# Altium footprint library Cty1.PcbLib: 869 footprints (part 54 of 55)
Each footprint in its own frame and in the unit in brackets; x right, y up, seen from the top. Pads: shape width x height; smd on the part's side, far side on the other; paste and mask are expansions set on the pad; w line width, h text height; cw(c..) or ccw(c..) is an arc to the next point about the centre after c.
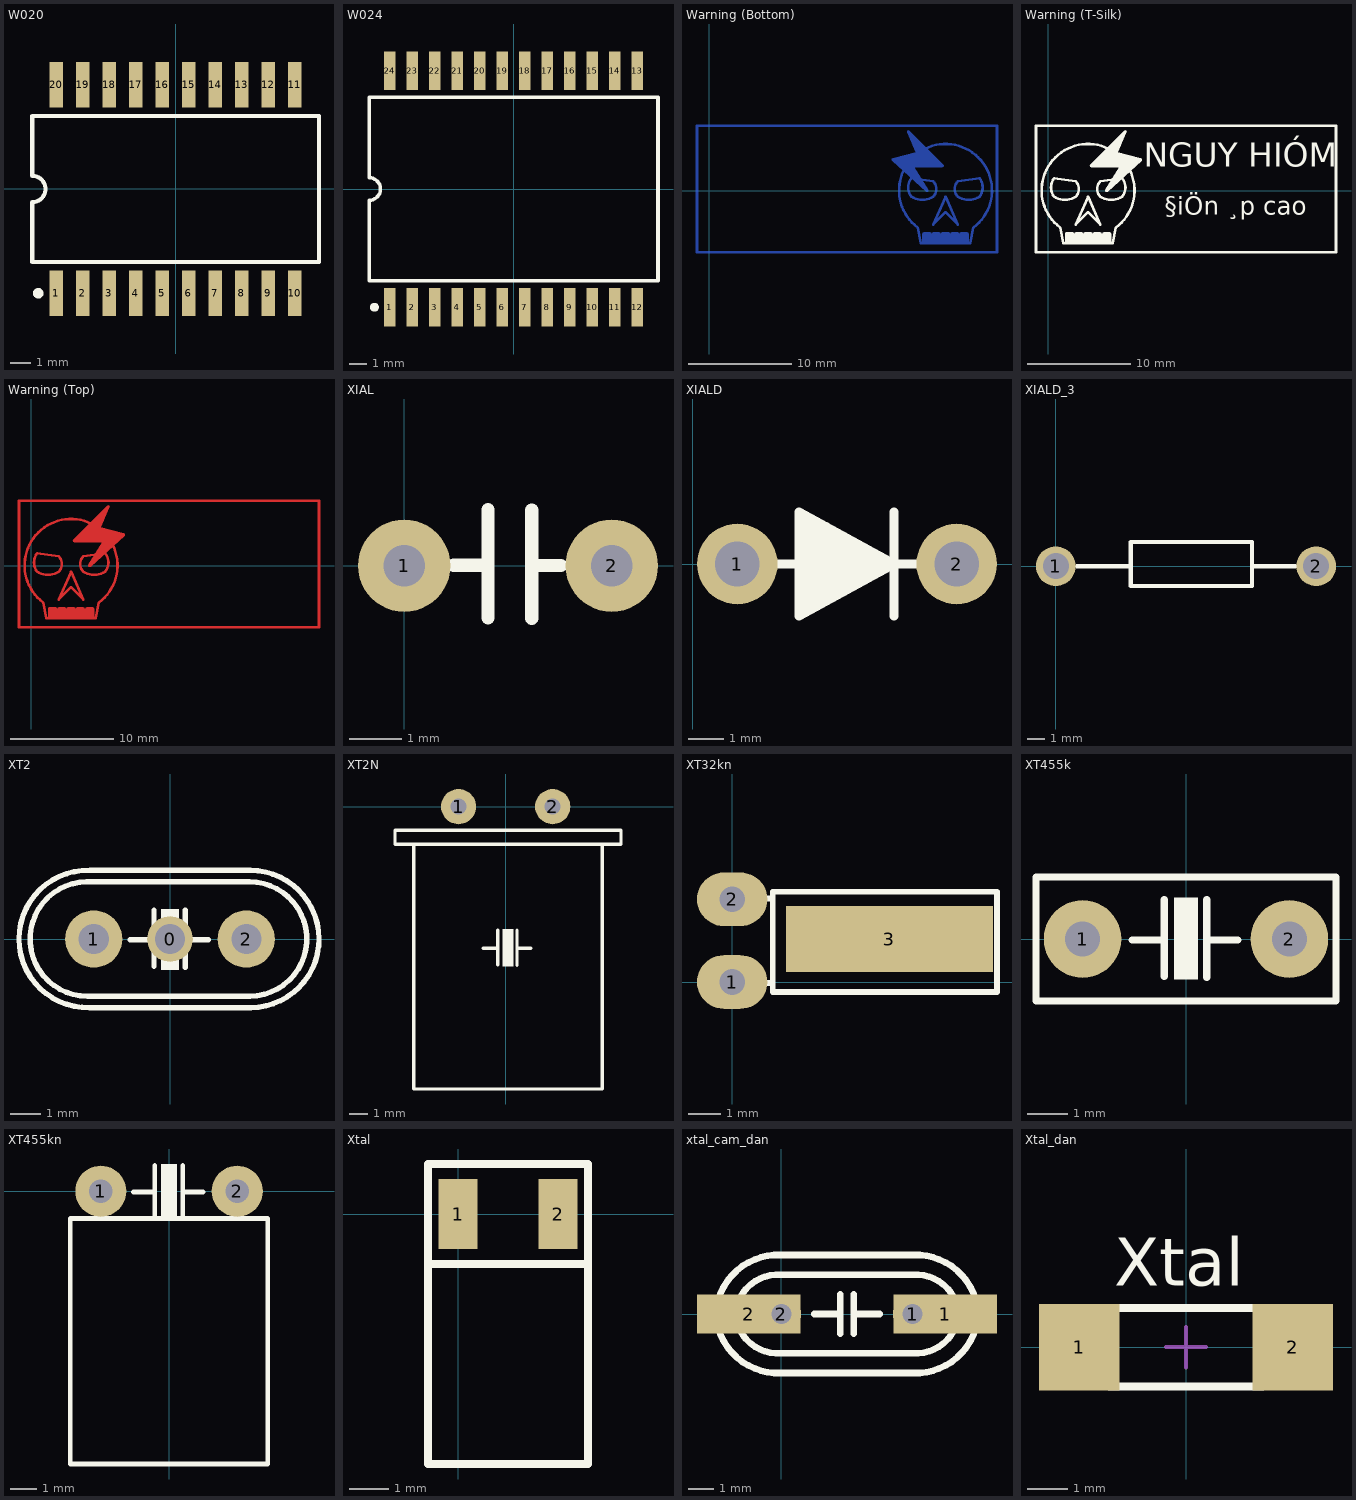
[diagram p53: the footprints below, top view; thin cyan lines are the x and y axes]

## W020 [mm] "DFP; 20 Leads; Body 13.7 x 7.6 mm (LxW max); Pitch 1.27 mm"
height 2.54
pads (20):
  rect 0.65x2.2 smd: 1(-5.715,-5) 2(-4.445,-5) 3(-3.175,-5) 4(-1.905,-5) 5(-0.635,-5) 6(0.635,-5) 7(1.905,-5) 8(3.175,-5) 9(4.445,-5) 10(5.715,-5) 11(5.715,5) 12(4.445,5) 13(3.175,5) 14(1.905,5) 15(0.635,5) 16(-0.635,5) 17(-1.905,5) 18(-3.175,5) 19(-4.445,5) 20(-5.715,5)
Top Overlay:
  circle w0.25: c-6.59,-5 r0.125
  lines w0.2: -6.875,-3.5 6.875,-3.5 6.875,3.5 -6.875,3.5 -6.875,0.635 cw(c-6.875,0) -6.875,-0.635 -6.875,-3.5

## W024 [mm] "DFP; 24 Leads; Body 16.3 x 9.5 mm (LxW max); Pitch 1.27 mm"
height 2.29
pads (24):
  rect 0.65x2.2 smd: 1(-6.985,-6.675) 2(-5.715,-6.675) 3(-4.445,-6.675) 4(-3.175,-6.675) 5(-1.905,-6.675) 6(-0.635,-6.675) 7(0.635,-6.675) 8(1.905,-6.675) 9(3.175,-6.675) 10(4.445,-6.675) 11(5.715,-6.675) 12(6.985,-6.675) 13(6.985,6.675) 14(5.715,6.675) 15(4.445,6.675) 16(3.175,6.675) 17(1.905,6.675) 18(0.635,6.675) 19(-0.635,6.675) 20(-1.905,6.675) 21(-3.175,6.675) 22(-4.445,6.675) 23(-5.715,6.675) 24(-6.985,6.675)
Top Overlay:
  circle w0.25: c-7.86,-6.675 r0.125
  lines w0.2: -8.15,-5.175 -8.15,-0.635 ccw(c-8.15,0) -8.15,0.635 -8.15,5.175 8.15,5.175 8.15,-5.175 -8.15,-5.175

## Warning (Bottom) [mil]
Bottom Layer:
  region: 760.38,229.5 759.27,229.49 758.54,228.74 757.57,228.34 757.15,227.32 756.38,226.53 756.39,225.48 755.99,224.52 756.41,223.49 756.43,222.38 789.37,145.51 701,123.43 699.74,122.5 698.31,121.82 698.12,121.3 697.68,120.97 697.44,119.41 696.91,117.93 697.15,117.42 697.07,116.87 698,115.6 698.68,114.18 828.66,-4 829.96,-4.47 831.08,-5.27 831.84,-5.15 832.56,-5.41 833.81,-4.82 835.17,-4.59 835.61,-3.97 836.3,-3.64 836.77,-2.34 837.57,-1.22 837.45,-0.46 837.71,0.26 837.12,1.51 836.89,2.87 782.98,89.12 891.38,89.12 895.21,90.71 896.8,94.53 895.21,98.36 765.23,228.34 764.2,228.77 763.41,229.54 762.37,229.53 761.4,229.93
  region: 958.46,-161.61 956.87,-165.43 956.87,-200.88 958.46,-204.71 962.28,-206.3 985.92,-206.3 989.74,-204.71 991.33,-200.88 991.33,-165.43 989.74,-161.61 985.92,-160.02 962.28,-160.02
  region: 852.11,-161.61 850.52,-165.43 850.52,-200.88 852.11,-204.71 855.93,-206.3 879.57,-206.3 883.39,-204.71 884.98,-200.88 884.98,-165.43 883.39,-161.61 879.57,-160.02 855.93,-160.02
  region: 816.66,-161.61 815.07,-165.43 815.07,-200.88 816.66,-204.71 820.48,-206.3 844.12,-206.3 847.94,-204.71 849.53,-200.88 849.53,-165.43 847.94,-161.61 844.12,-160.02 820.48,-160.02
  region: 923.01,-161.61 921.42,-165.43 921.42,-200.88 923.01,-204.71 926.83,-206.3 950.47,-206.3 954.29,-204.71 955.88,-200.88 955.88,-165.43 954.29,-161.61 950.47,-160.02 926.83,-160.02
  region: 887.56,-161.61 885.97,-165.43 885.97,-200.88 887.56,-204.71 891.38,-206.3 915,-206.3 918.83,-204.71 920.41,-200.88 920.41,-165.43 918.83,-161.61 915,-160.02 891.38,-160.02
  lines w10: -47.27,-236.33 1100,-236.33 1100,248.15 -47.27,248.15 -47.27,-236.33 ; 702.32,118.18 796.85,141.8 761.4,224.52 891.38,94.53 773.22,94.53 832.3,0 702.32,118.18 ; 773.22,-23.63 ccw(c814.58,41.35) 855.93,-23.63 ccw(c826.4,5.9) 855.93,35.45 773.22,47.27 ccw(c814.58,11.82) 773.22,-23.63 ; 796.85,-141.8 cw(c903.2,0.53) 1009.55,-141.8 997.73,-200.88 808.67,-200.88 796.85,-141.8 ; 855.93,-129.98 903.2,-23.63 950.47,-129.98 903.2,-82.72 855.93,-129.98 ; 950.46,-23.64 cw(c980,5.9) 950.47,35.45 1033.18,47.27 cw(c985.92,11.82) 1033.18,-23.63 cw(c991.83,41.35) 950.47,-23.63
  text "§iÖn ¸p cao" at 580,-120 h118.11
  text "NGUY HIÓM" at 690,45 h157.48

## Warning (T-Silk) [mil]
Top Overlay:
  region: 167.44,-161.61 169.03,-165.43 169.03,-200.88 167.44,-204.71 163.62,-206.3 140,-206.3 136.17,-204.71 134.59,-200.88 134.59,-165.43 136.17,-161.61 140,-160.02 163.62,-160.02
  region: 131.99,-161.61 133.58,-165.43 133.58,-200.88 131.99,-204.71 128.17,-206.3 104.53,-206.3 100.71,-204.71 99.12,-200.88 99.12,-165.43 100.71,-161.61 104.53,-160.02 128.17,-160.02
  region: 238.34,-161.61 239.93,-165.43 239.93,-200.88 238.34,-204.71 234.52,-206.3 210.88,-206.3 207.06,-204.71 205.47,-200.88 205.47,-165.43 207.06,-161.61 210.88,-160.02 234.52,-160.02
  region: 202.89,-161.61 204.48,-165.43 204.48,-200.88 202.89,-204.71 199.07,-206.3 175.43,-206.3 171.61,-204.71 170.02,-200.88 170.02,-165.43 171.61,-161.61 175.43,-160.02 199.07,-160.02
  region: 96.54,-161.61 98.13,-165.43 98.13,-200.88 96.54,-204.71 92.72,-206.3 69.08,-206.3 65.26,-204.71 63.67,-200.88 63.67,-165.43 65.26,-161.61 69.08,-160.02 92.72,-160.02
  region: 294.62,229.5 295.73,229.49 296.46,228.74 297.43,228.34 297.85,227.32 298.62,226.53 298.61,225.48 299.01,224.52 298.59,223.49 298.57,222.38 265.63,145.51 354,123.43 355.26,122.5 356.69,121.82 356.88,121.3 357.32,120.97 357.56,119.41 358.09,117.93 357.85,117.42 357.93,116.87 357,115.6 356.32,114.18 226.34,-4 225.04,-4.47 223.92,-5.27 223.16,-5.15 222.44,-5.41 221.19,-4.82 219.83,-4.59 219.39,-3.97 218.7,-3.64 218.23,-2.34 217.43,-1.22 217.55,-0.46 217.29,0.26 217.88,1.51 218.11,2.87 272.02,89.12 163.62,89.12 159.79,90.71 158.2,94.53 159.79,98.36 289.77,228.34 290.8,228.77 291.59,229.54 292.63,229.53 293.6,229.93
  lines w10: -47.27,-236.33 -47.27,248.15 1100,248.15 1100,-236.33 -47.27,-236.33 ; 21.81,-23.64 ccw(c63.17,41.35) 104.53,-23.63 ccw(c75,5.9) 104.53,35.45 21.82,47.27 ccw(c69.08,11.82) 21.82,-23.63 ; 45.45,-141.8 cw(c151.8,0.53) 258.15,-141.8 246.33,-200.88 57.27,-200.88 45.45,-141.8 ; 104.53,-129.98 151.8,-23.63 199.07,-129.98 151.8,-82.72 104.53,-129.98 ; 163.62,94.53 293.6,224.52 258.15,141.8 352.68,118.18 222.7,0 281.78,94.53 163.62,94.53 ; 199.06,-23.64 cw(c228.6,5.9) 199.07,35.45 281.78,47.27 cw(c240.42,11.82) 281.78,-23.63 cw(c240.42,41.35) 199.07,-23.63
  text "NGUY HIÓM" at 365,60 h157.48
  text "§iÖn ¸p cao" at 445,-115 h118.11

## Warning (Top) [mil]
Top Layer:
  region: 167.44,-161.61 169.03,-165.43 169.03,-200.88 167.44,-204.71 163.62,-206.3 140,-206.3 136.17,-204.71 134.59,-200.88 134.59,-165.43 136.17,-161.61 140,-160.02 163.62,-160.02
  region: 131.99,-161.61 133.58,-165.43 133.58,-200.88 131.99,-204.71 128.17,-206.3 104.53,-206.3 100.71,-204.71 99.12,-200.88 99.12,-165.43 100.71,-161.61 104.53,-160.02 128.17,-160.02
  region: 238.34,-161.61 239.93,-165.43 239.93,-200.88 238.34,-204.71 234.52,-206.3 210.88,-206.3 207.06,-204.71 205.47,-200.88 205.47,-165.43 207.06,-161.61 210.88,-160.02 234.52,-160.02
  region: 202.89,-161.61 204.48,-165.43 204.48,-200.88 202.89,-204.71 199.07,-206.3 175.43,-206.3 171.61,-204.71 170.02,-200.88 170.02,-165.43 171.61,-161.61 175.43,-160.02 199.07,-160.02
  region: 96.54,-161.61 98.13,-165.43 98.13,-200.88 96.54,-204.71 92.72,-206.3 69.08,-206.3 65.26,-204.71 63.67,-200.88 63.67,-165.43 65.26,-161.61 69.08,-160.02 92.72,-160.02
  region: 294.62,229.5 295.73,229.49 296.46,228.74 297.43,228.34 297.85,227.32 298.62,226.53 298.61,225.48 299.01,224.52 298.59,223.49 298.57,222.38 265.63,145.51 354,123.43 355.26,122.5 356.69,121.82 356.88,121.3 357.32,120.97 357.56,119.41 358.09,117.93 357.85,117.42 357.93,116.87 357,115.6 356.32,114.18 226.34,-4 225.04,-4.47 223.92,-5.27 223.16,-5.15 222.44,-5.41 221.19,-4.82 219.83,-4.59 219.39,-3.97 218.7,-3.64 218.23,-2.34 217.43,-1.22 217.55,-0.46 217.29,0.26 217.88,1.51 218.11,2.87 272.02,89.12 163.62,89.12 159.79,90.71 158.2,94.53 159.79,98.36 289.77,228.34 290.8,228.77 291.59,229.54 292.63,229.53 293.6,229.93
  lines w10: -47.27,-236.33 -47.27,248.15 1100,248.15 1100,-236.33 -47.27,-236.33 ; 21.81,-23.64 ccw(c63.17,41.35) 104.53,-23.63 ccw(c75,5.9) 104.53,35.45 21.82,47.27 ccw(c69.08,11.82) 21.82,-23.63 ; 45.45,-141.8 cw(c151.8,0.53) 258.15,-141.8 246.33,-200.88 57.27,-200.88 45.45,-141.8 ; 104.53,-129.98 151.8,-23.63 199.07,-129.98 151.8,-82.72 104.53,-129.98 ; 163.62,94.53 293.6,224.52 258.15,141.8 352.68,118.18 222.7,0 281.78,94.53 163.62,94.53 ; 199.06,-23.64 cw(c228.6,5.9) 199.07,35.45 281.78,47.27 cw(c240.42,11.82) 281.78,-23.63 cw(c240.42,41.35) 199.07,-23.63
  text "NGUY HIÓM" at 365,60 h157.48
  text "§iÖn ¸p cao" at 445,-115 h118.11

## XIAL [mil]
pads (2):
  round 70 hole 31.5 unplated: 1(0,0) 2(157.48,0)
Top Overlay:
  lines w10: 37.4,0.4 53.6,0.4 63.6,0.4 ; 63.6,-39.6 63.6,0.4 ; 63.6,42.4 63.6,0.4 ; 96.8,-39.8 96.8,42.2 ; 96.8,0.2 104.8,0.2 119,0.2

## XIALD [mil]
pads (2):
  round 90 hole 50 unplated: 1(50,0) 2(295,0)
Top Overlay:
  lines w10: 65,0 119,0 ; 127,-48 127,50 ; 127,46 135,46 135,-42 143,-42 143,42 149,42 149,-32 157,-32 157,34 163,34 163,-28 171,-28 171,24 179,24 179,-20 185,-20 185,18 191,18 191,-14 197,-14 197,12 201,12 201,-8 207,-8 ; 220,0 265,0 ; 225,-58 225,0 ; 225,58 225,0 ; 119,0 119,-58 225,0 ; 119,0 119,58 225,0 ; 207,-8 211,-8 211,8 207,8 207,-8

## XIALD_3 [mil]
pads (2):
  round 90 hole 59.05 unplated: 1(0,0) 2(590.55,0)
Top Overlay:
  lines w10: 47.95,0 166.06,0 ; 447.59,0 542.76,0 ; 170,-45 170,55 445,55 445,-45 170,-45

## XT2 [mm] "Footpin for Crystal 2 pin"
pads (3):
  round 1.524 hole 1: 0(0,0)
  round 1.905 hole 1: 1(-2.54,0) 2(2.54,0)
Top Overlay:
  region: 0.292,0.991 0.292,-1.016 -0.292,-1.016 -0.292,0.991
  lines w0.178: -2.769,1.905 ccw(c-2.756,0) -2.75,-1.905 ; -2.717,-1.905 2.617,-1.905 ; -2.692,1.905 2.642,1.905 ; -2.668,-2.286 2.69,-2.286 ccw(c2.675,0) 2.668,2.286 -2.666,2.286 ccw(c-2.743,0.001) -2.668,-2.283 ; -1.321,-0.025 -0.533,-0.025 ; -0.533,-0.914 -0.533,0.965 ; 0.508,-0.94 0.508,0.965 ; 0.508,-0.025 1.27,-0.025 ; 2.642,1.905 cw(c2.647,0) 2.66,-1.905
3D body: height 3.5, standoff -4, extent -5.929,-2.364 5.421,2.286

## XT2N [mil] "Crystal 2pin, high 200 mil"
height 200
pads (2):
  round 75 hole 34: 1(-100,0) 2(100,0)
Top Overlay:
  region: 16.5,-260 16.5,-339 -6.5,-339 -6.5,-260
  lines w7: -48,-301 -17,-301 ; -17,-336 -17,-262 ; 24,-337 24,-262 ; 24,-301 54,-301 ; -235,-80 -235,-50 ; -235,-80 -195,-80 ; -235,-80 -235,-50 ; -235,-80 -195,-80 ; -235,-50 245,-50 ; -235,-50 245,-50 ; -195,-600 205,-600 ; -195,-600 -195,-80 ; -195,-600 205,-600 ; -195,-600 -195,-80 ; -195,-80 205,-80 ; -195,-80 205,-80 ; 205,-600 205,-80 ; 205,-600 205,-80 ; 205,-80 245,-80 ; 205,-80 245,-80 ; 245,-80 245,-50 ; 245,-80 245,-50
3D body: height 91.44, standoff -92.52, extent -209.86,-594.33 230,14.33

## XT32kn [mil] "Crystal for 32,768kHz, 2pin"
height 150
pads (3):
  oval 85x65 hole 31: 1(0,0) 2(0,100)
  rect 250x80 smd: 3(190,52)
Top Overlay:
  lines w7: 34,-1 49,-1 ; 35,101 49,101 ; 49,101 49,-12 320,-12 320,109 49,109 49,101

## XT455k [mil] "Thach anh 455khz (Infrared)"
pads (2):
  round 75 hole 34: 1(-100,0) 2(100,0)
Top Overlay:
  region: 11.5,40 11.5,-39 -11.5,-39 -11.5,40
  lines w7: -52,-1 -21,-1 ; -21,-36 -21,38 ; 20,-37 20,38 ; 20,-1 50,-1 ; -145,-60 -145,60 145,60 145,-60 -145,-60

## XT455kn [mil] "Thach anh 455khz (Infrared)"
pads (2):
  round 75 hole 34: 1(-100,0) 2(100,0)
Top Overlay:
  region: 11.5,40 11.5,-39 -11.5,-39 -11.5,40
  lines w7: -52,-1 -21,-1 ; -21,-36 -21,38 ; 20,-37 20,38 ; 20,-1 50,-1 ; -145,-400 145,-400 145,-40 -145,-40 -145,-400

## Xtal [mil] "thach anh dan loai nho"
height 23.62
pads (2):
  rect 39.37x70 smd: 1(0,0) 2(100,0)
Top Overlay:
  lines w7.87: -30,-50 130,-50 ; -30,-250 -30,-220 -30,50 130,50 130,-250 -30,-250

## xtal_cam_dan [mil]
pads (4):
  round 60 hole 30: 1(200,0) 2(0,0)
  rect 157.48x60 smd: 1(250,0) 2(-50,0)
Top Overlay:
  lines w10: 50,0 60,0 90,0 ; 90,-30 90,30 ; 110,-30 110,30 ; 110,0 150,0 120,0 ; -100,0 cw(c-5,-5) 0,90 200,90 cw(c205,-5) 300,0 cw(c205,5) 200,-90 0,-90 cw(c-5,5) -100,0 ; -70,0 cw(c-5,-5) 0,60 200,60 cw(c205,-5) 270,0 cw(c205,5) 200,-60 0,-60 cw(c-5,5) -70,0

## Xtal_dan [mm] "Thach Anh Dan 5.08mm"
height 3
pads (2):
  rect 2x2.15 smd: 1(-2.65,0) 2(2.65,0)
Top Overlay:
  lines w0.2: -1.9,-0.975 1.9,-0.975 ; -1.9,0.975 1.9,0.975
  text "Xtal" at -1.778,1.524 h1.2
Mechanical 13:
  lines w0.1: -2.54,-1 2.54,-1 2.54,1 -2.54,1 -2.54,-1
Mechanical 15:
  lines w0.1: -0.5,0 0.5,0 ; 0,-0.5 0,0.5
3D body: height 3, standoff 0, extent -2.54,-1 2.54,1